# Altium footprint library 7-Connectors-12.PcbLib: 76 footprints (part 2 of 5)
Each footprint in its own frame and in the unit in brackets; x right, y up, seen from the top. Pads: shape width x height; smd on the part's side, far side on the other; paste and mask are expansions set on the pad; w line width, h text height; cw(c..) or ccw(c..) is an arc to the next point about the centre after c.
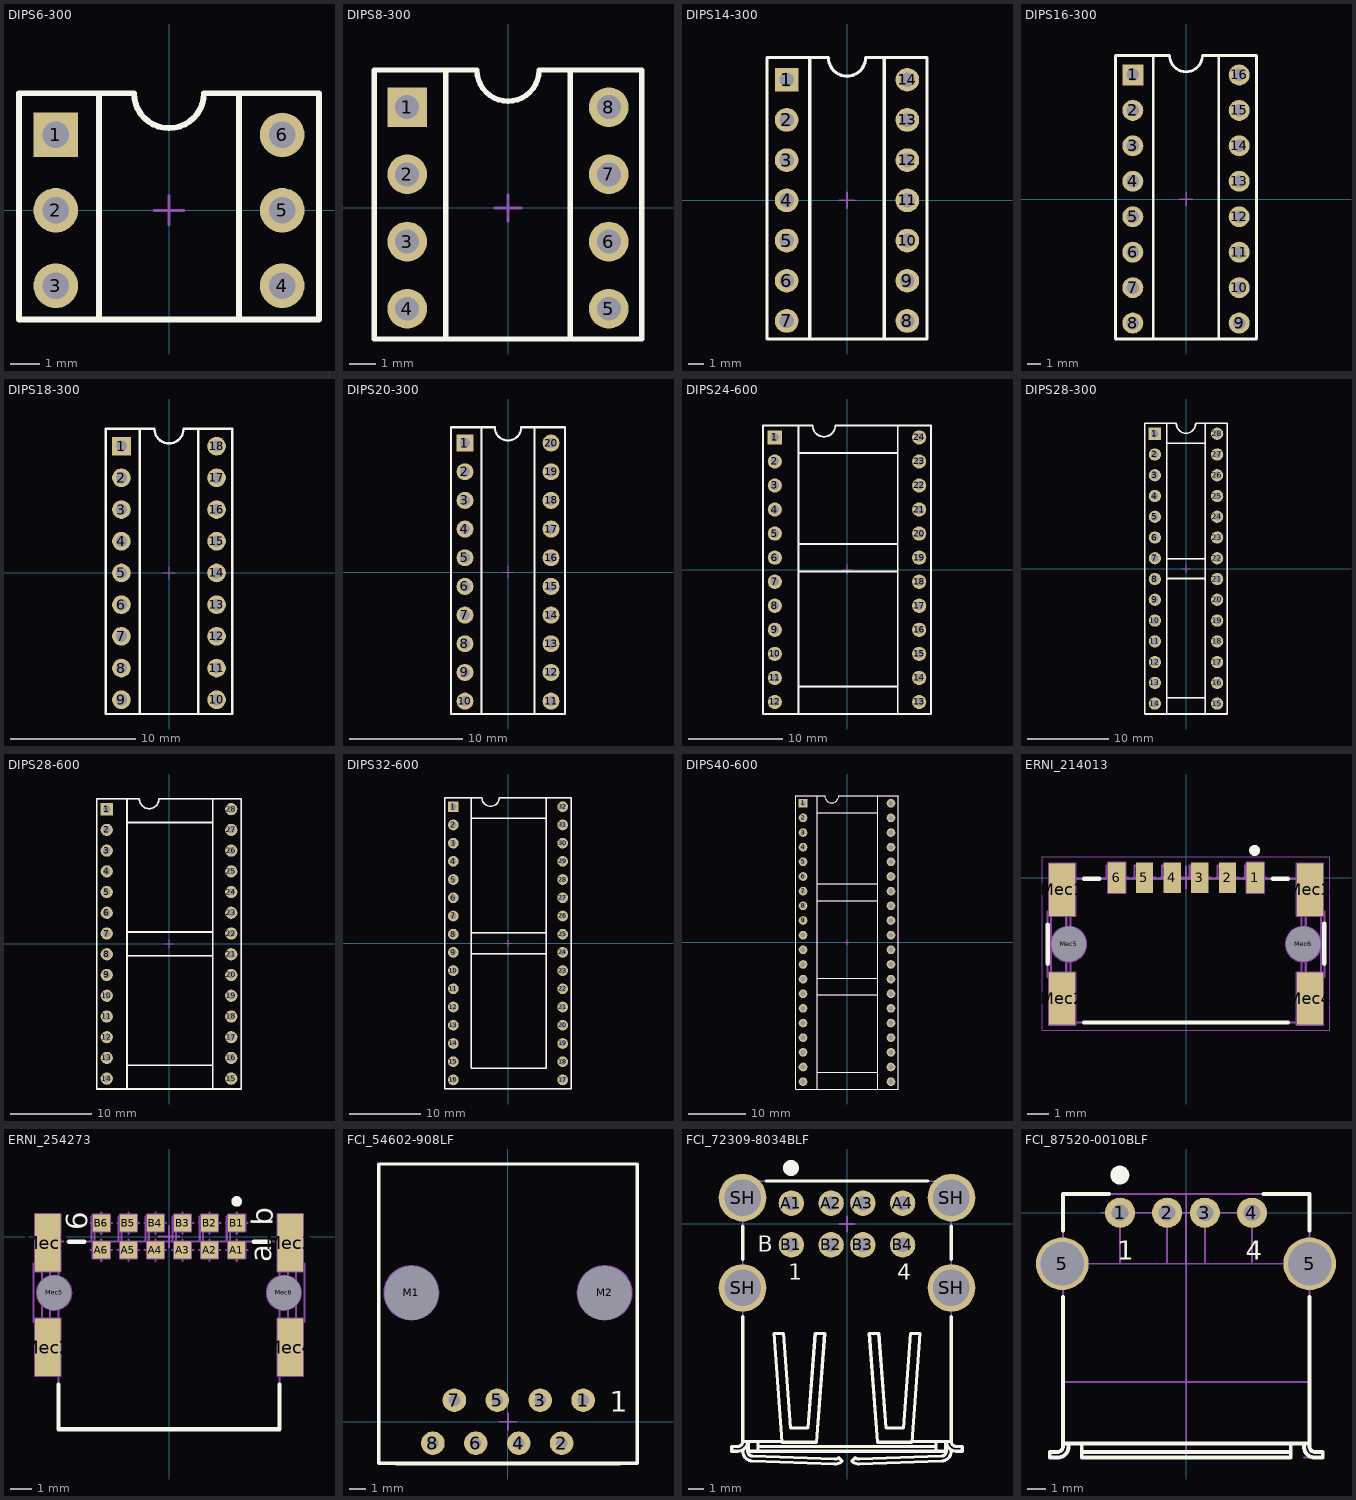
[diagram p1: the footprints below, top view; thin cyan lines are the x and y axes]

## DIPS6-300 [mm] "DIP Socket 6 Leads, Row Spacing 7.62 mm; Pitch 2.54 mm"
height 4.2
pads (6):
  rect 1.5x1.5 hole 0.9: 1(-3.81,2.54)
  round 1.5 hole 0.9: 2(-3.81,0) 3(-3.81,-2.54) 4(3.81,-2.54) 5(3.81,0) 6(3.81,2.54)
Top Overlay:
  lines w0.2: -2.35,-3.68 -2.35,3.94 ; 2.35,-3.68 2.35,3.94 ; -5.05,-3.68 5.05,-3.68 5.05,3.94 1.175,3.94 cw(c0,3.94) -1.175,3.94 -5.05,3.94 -5.05,-3.68
Mechanical 8:
  lines w0.1: -4.31,-2.41 -3.81,-2.41 ; -4.31,0.13 -3.81,0.13 ; -4.31,2.67 -3.81,2.67 ; -3.81,-2.91 -3.81,-2.41 ; -3.81,-1.91 -3.81,-2.41 ; -3.81,-0.37 -3.81,0.13 ; -3.81,0.63 -3.81,0.13 ; -3.81,2.17 -3.81,2.67 ; -3.81,3.17 -3.81,2.67 ; -3.31,-2.41 -3.81,-2.41 ; -3.31,0.13 -3.81,0.13 ; -3.31,2.67 -3.81,2.67 ; -0.5,0 0,0 ; 0,-0.5 0,0 ; 0,0.5 0,0 ; 0.5,0 0,0 ; 3.31,-2.41 3.81,-2.41 ; 3.31,0.13 3.81,0.13 ; 3.31,2.67 3.81,2.67 ; 3.81,-2.91 3.81,-2.41 ; 3.81,-1.91 3.81,-2.41 ; 3.81,-0.37 3.81,0.13 ; 3.81,0.63 3.81,0.13 ; 3.81,2.17 3.81,2.67 ; 3.81,3.17 3.81,2.67 ; 4.31,-2.41 3.81,-2.41 ; 4.31,0.13 3.81,0.13 ; 4.31,2.67 3.81,2.67
Mechanical 14:
  lines w0.1: -2.35,-3.68 -2.35,3.94 ; 2.35,-3.68 2.35,3.94 ; -5.05,-3.68 5.05,-3.68 5.05,3.94 1.175,3.94 cw(c0,3.94) -1.175,3.94 -5.05,3.94 -5.05,-3.68
3D body "DIPS6-300.stp": height 4.2, standoff -3.17, extent -5.05,-3.68 5.05,3.94

## DIPS8-300 [mm] "DIP Socket 8 Leads, Row Spacing 7.62 mm; Pitch 2.54 mm"
height 4.2
pads (8):
  rect 1.5x1.5 hole 0.9: 1(-3.81,3.81)
  round 1.5 hole 0.9: 2(-3.81,1.27) 3(-3.81,-1.27) 4(-3.81,-3.81) 5(3.81,-3.81) 6(3.81,-1.27) 7(3.81,1.27) 8(3.81,3.81)
Top Overlay:
  lines w0.2: -2.35,-4.95 -2.35,5.21 ; 2.35,-4.95 2.35,5.21 ; -5.05,-4.95 -5.05,5.21 -1.175,5.21 ccw(c0,5.21) 1.175,5.21 5.05,5.21 5.05,-4.95 -5.05,-4.95
Mechanical 8:
  lines w0.1: -4.31,-3.68 -3.81,-3.68 ; -4.31,-1.14 -3.81,-1.14 ; -4.31,1.4 -3.81,1.4 ; -4.31,3.94 -3.81,3.94 ; -3.81,-4.18 -3.81,-3.68 ; -3.81,-3.18 -3.81,-3.68 ; -3.81,-1.64 -3.81,-1.14 ; -3.81,-0.64 -3.81,-1.14 ; -3.81,0.9 -3.81,1.4 ; -3.81,1.9 -3.81,1.4 ; -3.81,3.44 -3.81,3.94 ; -3.81,4.44 -3.81,3.94 ; -3.31,-3.68 -3.81,-3.68 ; -3.31,-1.14 -3.81,-1.14 ; -3.31,1.4 -3.81,1.4 ; -3.31,3.94 -3.81,3.94 ; -0.5,0 0,0 ; 0,-0.5 0,0 ; 0,0.5 0,0 ; 0.5,0 0,0 ; 3.31,-3.68 3.81,-3.68 ; 3.31,-1.14 3.81,-1.14 ; 3.31,1.4 3.81,1.4 ; 3.31,3.94 3.81,3.94 ; 3.81,-4.18 3.81,-3.68 ; 3.81,-3.18 3.81,-3.68 ; 3.81,-1.64 3.81,-1.14 ; 3.81,-0.64 3.81,-1.14 ; 3.81,0.9 3.81,1.4 ; 3.81,1.9 3.81,1.4 ; 3.81,3.44 3.81,3.94 ; 3.81,4.44 3.81,3.94 ; 4.31,-3.68 3.81,-3.68 ; 4.31,-1.14 3.81,-1.14 ; 4.31,1.4 3.81,1.4 ; 4.31,3.94 3.81,3.94
Mechanical 14:
  lines w0.1: -2.35,-4.95 -2.35,5.21 ; 2.35,-4.95 2.35,5.21 ; -5.05,-4.95 -5.05,5.21 -1.175,5.21 ccw(c0,5.21) 1.175,5.21 5.05,5.21 5.05,-4.95 -5.05,-4.95
3D body "DIPS8-300.stp": height 4.2, standoff -3.17, extent -5.05,-5.05 5.05,5.05

## DIPS14-300 [mm] "DIP  Socket 14 Leads, Row Spacing 7.62 mm; Pitch 2.54 mm"
height 4.2
pads (14):
  rect 1.5x1.5 hole 0.9: 1(-3.81,7.62)
  round 1.5 hole 0.9: 2(-3.81,5.08) 3(-3.81,2.54) 4(-3.81,0) 5(-3.81,-2.54) 6(-3.81,-5.08) 7(-3.81,-7.62) 8(3.81,-7.62) 9(3.81,-5.08) 10(3.81,-2.54) 11(3.81,0) 12(3.81,2.54) 13(3.81,5.08) 14(3.81,7.62)
Top Overlay:
  lines w0.2: -2.35,-8.76 -2.35,9.02 ; 2.35,-8.76 2.35,9.02 ; -5.05,-8.76 5.05,-8.76 5.05,9.02 1.175,9.02 cw(c0,9.02) -1.175,9.02 -5.05,9.02 -5.05,-8.76
Mechanical 8:
  lines w0.1: -4.31,-7.49 -3.81,-7.49 ; -4.31,-4.95 -3.81,-4.95 ; -4.31,-2.41 -3.81,-2.41 ; -4.31,0.13 -3.81,0.13 ; -4.31,2.67 -3.81,2.67 ; -4.31,5.21 -3.81,5.21 ; -4.31,7.75 -3.81,7.75 ; -3.81,-7.99 -3.81,-7.49 ; -3.81,-6.99 -3.81,-7.49 ; -3.81,-5.45 -3.81,-4.95 ; -3.81,-4.45 -3.81,-4.95 ; -3.81,-2.91 -3.81,-2.41 ; -3.81,-1.91 -3.81,-2.41 ; -3.81,-0.37 -3.81,0.13 ; -3.81,0.63 -3.81,0.13 ; -3.81,2.17 -3.81,2.67 ; -3.81,3.17 -3.81,2.67 ; -3.81,4.71 -3.81,5.21 ; -3.81,5.71 -3.81,5.21 ; -3.81,7.25 -3.81,7.75 ; -3.81,8.25 -3.81,7.75 ; -3.31,-7.49 -3.81,-7.49 ; -3.31,-4.95 -3.81,-4.95 ; -3.31,-2.41 -3.81,-2.41 ; -3.31,0.13 -3.81,0.13 ; -3.31,2.67 -3.81,2.67 ; -3.31,5.21 -3.81,5.21 ; -3.31,7.75 -3.81,7.75 ; -0.5,0 0,0 ; 0,-0.5 0,0 ; 0,0.5 0,0 ; 0.5,0 0,0 ; 3.31,-7.49 3.81,-7.49 ; 3.31,-4.95 3.81,-4.95 ; 3.31,-2.41 3.81,-2.41 ; 3.31,0.13 3.81,0.13 ; 3.31,2.67 3.81,2.67 ; 3.31,5.21 3.81,5.21 ; 3.31,7.75 3.81,7.75 ; 3.81,-7.99 3.81,-7.49 ; 3.81,-6.99 3.81,-7.49 ; 3.81,-5.45 3.81,-4.95 ; 3.81,-4.45 3.81,-4.95 ; 3.81,-2.91 3.81,-2.41 ; 3.81,-1.91 3.81,-2.41 ; 3.81,-0.37 3.81,0.13 ; 3.81,0.63 3.81,0.13 ; 3.81,2.17 3.81,2.67 ; 3.81,3.17 3.81,2.67 ; 3.81,4.71 3.81,5.21 ; 3.81,5.71 3.81,5.21 ; 3.81,7.25 3.81,7.75 ; 3.81,8.25 3.81,7.75 ; 4.31,-7.49 3.81,-7.49 ; 4.31,-4.95 3.81,-4.95 ; 4.31,-2.41 3.81,-2.41 ; 4.31,0.13 3.81,0.13 ; 4.31,2.67 3.81,2.67 ; 4.31,5.21 3.81,5.21 ; 4.31,7.75 3.81,7.75
Mechanical 14:
  lines w0.1: -2.35,-8.76 -2.35,9.02 ; 2.35,-8.76 2.35,9.02 ; -5.05,-8.76 5.05,-8.76 5.05,9.02 1.175,9.02 cw(c0,9.02) -1.175,9.02 -5.05,9.02 -5.05,-8.76
3D body "DIPS14-300.stp": height 4.2, standoff -3.17, extent -5.05,-8.8 5.05,8.98

## DIPS16-300 [mm] "DIP Socket 16 Leads, Row Spacing 7.62 mm; Pitch 2.54 mm"
height 4.2
pads (16):
  rect 1.5x1.5 hole 0.9: 1(-3.81,8.89)
  round 1.5 hole 0.9: 2(-3.81,6.35) 3(-3.81,3.81) 4(-3.81,1.27) 5(-3.81,-1.27) 6(-3.81,-3.81) 7(-3.81,-6.35) 8(-3.81,-8.89) 9(3.81,-8.89) 10(3.81,-6.35) 11(3.81,-3.81) 12(3.81,-1.27) 13(3.81,1.27) 14(3.81,3.81) 15(3.81,6.35) 16(3.81,8.89)
Top Overlay:
  lines w0.2: -2.35,-10.03 -2.35,10.29 ; 2.35,-10.03 2.35,10.29 ; -5.05,-10.03 -5.05,10.29 -1.175,10.29 ccw(c0,10.29) 1.175,10.29 5.05,10.29 5.05,-10.03 -5.05,-10.03
Mechanical 8:
  lines w0.1: -4.31,-8.76 -3.81,-8.76 ; -4.31,-6.22 -3.81,-6.22 ; -4.31,-3.68 -3.81,-3.68 ; -4.31,-1.14 -3.81,-1.14 ; -4.31,1.4 -3.81,1.4 ; -4.31,3.94 -3.81,3.94 ; -4.31,6.48 -3.81,6.48 ; -4.31,9.02 -3.81,9.02 ; -3.81,-9.26 -3.81,-8.76 ; -3.81,-8.26 -3.81,-8.76 ; -3.81,-6.72 -3.81,-6.22 ; -3.81,-5.72 -3.81,-6.22 ; -3.81,-4.18 -3.81,-3.68 ; -3.81,-3.18 -3.81,-3.68 ; -3.81,-1.64 -3.81,-1.14 ; -3.81,-0.64 -3.81,-1.14 ; -3.81,0.9 -3.81,1.4 ; -3.81,1.9 -3.81,1.4 ; -3.81,3.44 -3.81,3.94 ; -3.81,4.44 -3.81,3.94 ; -3.81,5.98 -3.81,6.48 ; -3.81,6.98 -3.81,6.48 ; -3.81,8.52 -3.81,9.02 ; -3.81,9.52 -3.81,9.02 ; -3.31,-8.76 -3.81,-8.76 ; -3.31,-6.22 -3.81,-6.22 ; -3.31,-3.68 -3.81,-3.68 ; -3.31,-1.14 -3.81,-1.14 ; -3.31,1.4 -3.81,1.4 ; -3.31,3.94 -3.81,3.94 ; -3.31,6.48 -3.81,6.48 ; -3.31,9.02 -3.81,9.02 ; -0.5,0 0,0 ; 0,-0.5 0,0 ; 0,0.5 0,0 ; 0.5,0 0,0 ; 3.31,-8.76 3.81,-8.76 ; 3.31,-6.22 3.81,-6.22 ; 3.31,-3.68 3.81,-3.68 ; 3.31,-1.14 3.81,-1.14 ; 3.31,1.4 3.81,1.4 ; 3.31,3.94 3.81,3.94 ; 3.31,6.48 3.81,6.48 ; 3.31,9.02 3.81,9.02 ; 3.81,-9.26 3.81,-8.76 ; 3.81,-8.26 3.81,-8.76 ; 3.81,-6.72 3.81,-6.22 ; 3.81,-5.72 3.81,-6.22 ; 3.81,-4.18 3.81,-3.68 ; 3.81,-3.18 3.81,-3.68 ; 3.81,-1.64 3.81,-1.14 ; 3.81,-0.64 3.81,-1.14 ; 3.81,0.9 3.81,1.4 ; 3.81,1.9 3.81,1.4 ; 3.81,3.44 3.81,3.94 ; 3.81,4.44 3.81,3.94 ; 3.81,5.98 3.81,6.48 ; 3.81,6.98 3.81,6.48 ; 3.81,8.52 3.81,9.02 ; 3.81,9.52 3.81,9.02 ; 4.31,-8.76 3.81,-8.76 ; 4.31,-6.22 3.81,-6.22 ; 4.31,-3.68 3.81,-3.68 ; 4.31,-1.14 3.81,-1.14 ; 4.31,1.4 3.81,1.4 ; 4.31,3.94 3.81,3.94 ; 4.31,6.48 3.81,6.48 ; 4.31,9.02 3.81,9.02
Mechanical 14:
  lines w0.1: -2.35,-10.03 -2.35,10.29 ; 2.35,-10.03 2.35,10.29 ; -5.05,-10.03 -5.05,10.29 -1.175,10.29 ccw(c0,10.29) 1.175,10.29 5.05,10.29 5.05,-10.03 -5.05,-10.03
3D body "DIPS16-300.stp": height 4.2, standoff -3.17, extent -5.05,-10.16 5.05,10.16

## DIPS18-300 [mm] "DIP Socket 18 Leads, Row Spacing 7.62 mm; Pitch 2.54 mm"
height 4.2
pads (18):
  rect 1.5x1.5 hole 0.9: 1(-3.81,10.16)
  round 1.5 hole 0.9: 2(-3.81,7.62) 3(-3.81,5.08) 4(-3.81,2.54) 5(-3.81,0) 6(-3.81,-2.54) 7(-3.81,-5.08) 8(-3.81,-7.62) 9(-3.81,-10.16) 10(3.81,-10.16) 11(3.81,-7.62) 12(3.81,-5.08) 13(3.81,-2.54) 14(3.81,0) 15(3.81,2.54) 16(3.81,5.08) 17(3.81,7.62) 18(3.81,10.16)
Top Overlay:
  lines w0.2: -2.35,-11.3 -2.35,11.56 ; 2.35,-11.3 2.35,11.56 ; -5.05,-11.3 5.05,-11.3 5.05,11.56 1.175,11.56 cw(c0,11.56) -1.175,11.56 -5.05,11.56 -5.05,-11.3
Mechanical 8:
  lines w0.05: -3.81,-10.44 -3.935,-10.44 -3.935,-9.88 -3.81,-9.88 ; -3.81,-7.9 -3.935,-7.9 -3.935,-7.34 -3.81,-7.34 ; -3.81,-5.36 -3.935,-5.36 -3.935,-4.8 -3.81,-4.8 ; -3.81,-2.82 -3.935,-2.82 -3.935,-2.26 -3.81,-2.26 ; -3.81,-0.28 -3.935,-0.28 -3.935,0.28 -3.81,0.28 ; -3.81,2.26 -3.935,2.26 -3.935,2.82 -3.81,2.82 ; -3.81,4.8 -3.935,4.8 -3.935,5.36 -3.81,5.36 ; -3.81,7.34 -3.935,7.34 -3.935,7.9 -3.81,7.9 ; -3.81,9.88 -3.935,9.88 -3.935,10.44 -3.81,10.44 ; 3.81,-10.44 3.935,-10.44 3.935,-9.88 3.81,-9.88 ; 3.81,-7.9 3.935,-7.9 3.935,-7.34 3.81,-7.34 ; 3.81,-5.36 3.935,-5.36 3.935,-4.8 3.81,-4.8 ; 3.81,-2.82 3.935,-2.82 3.935,-2.26 3.81,-2.26 ; 3.81,-0.28 3.935,-0.28 3.935,0.28 3.81,0.28 ; 3.81,2.26 3.935,2.26 3.935,2.82 3.81,2.82 ; 3.81,4.8 3.935,4.8 3.935,5.36 3.81,5.36 ; 3.81,7.34 3.935,7.34 3.935,7.9 3.81,7.9 ; 3.81,9.88 3.935,9.88 3.935,10.44 3.81,10.44
  lines w0.1: -4.31,-10.03 -3.81,-10.03 ; -4.31,-7.49 -3.81,-7.49 ; -4.31,-4.95 -3.81,-4.95 ; -4.31,-2.41 -3.81,-2.41 ; -4.31,0.13 -3.81,0.13 ; -4.31,2.67 -3.81,2.67 ; -4.31,5.21 -3.81,5.21 ; -4.31,7.75 -3.81,7.75 ; -4.31,10.29 -3.81,10.29 ; -3.81,-10.53 -3.81,-10.03 ; -3.81,-9.53 -3.81,-10.03 ; -3.81,-7.99 -3.81,-7.49 ; -3.81,-6.99 -3.81,-7.49 ; -3.81,-5.45 -3.81,-4.95 ; -3.81,-4.45 -3.81,-4.95 ; -3.81,-2.91 -3.81,-2.41 ; -3.81,-1.91 -3.81,-2.41 ; -3.81,-0.37 -3.81,0.13 ; -3.81,0.63 -3.81,0.13 ; -3.81,2.17 -3.81,2.67 ; -3.81,3.17 -3.81,2.67 ; -3.81,4.71 -3.81,5.21 ; -3.81,5.71 -3.81,5.21 ; -3.81,7.25 -3.81,7.75 ; -3.81,8.25 -3.81,7.75 ; -3.81,9.79 -3.81,10.29 ; -3.81,10.79 -3.81,10.29 ; -3.31,-10.03 -3.81,-10.03 ; -3.31,-7.49 -3.81,-7.49 ; -3.31,-4.95 -3.81,-4.95 ; -3.31,-2.41 -3.81,-2.41 ; -3.31,0.13 -3.81,0.13 ; -3.31,2.67 -3.81,2.67 ; -3.31,5.21 -3.81,5.21 ; -3.31,7.75 -3.81,7.75 ; -3.31,10.29 -3.81,10.29 ; -0.5,0 0,0 ; 0,-0.5 0,0 ; 0,0.5 0,0 ; 0.5,0 0,0 ; 3.31,-10.03 3.81,-10.03 ; 3.31,-7.49 3.81,-7.49 ; 3.31,-4.95 3.81,-4.95 ; 3.31,-2.41 3.81,-2.41 ; 3.31,0.13 3.81,0.13 ; 3.31,2.67 3.81,2.67 ; 3.31,5.21 3.81,5.21 ; 3.31,7.75 3.81,7.75 ; 3.31,10.29 3.81,10.29 ; 3.81,-10.53 3.81,-10.03 ; 3.81,-9.53 3.81,-10.03 ; 3.81,-7.99 3.81,-7.49 ; 3.81,-6.99 3.81,-7.49 ; 3.81,-5.45 3.81,-4.95 ; 3.81,-4.45 3.81,-4.95 ; 3.81,-2.91 3.81,-2.41 ; 3.81,-1.91 3.81,-2.41 ; 3.81,-0.37 3.81,0.13 ; 3.81,0.63 3.81,0.13 ; 3.81,2.17 3.81,2.67 ; 3.81,3.17 3.81,2.67 ; 3.81,4.71 3.81,5.21 ; 3.81,5.71 3.81,5.21 ; 3.81,7.25 3.81,7.75 ; 3.81,8.25 3.81,7.75 ; 3.81,9.79 3.81,10.29 ; 3.81,10.79 3.81,10.29 ; 4.31,-10.03 3.81,-10.03 ; 4.31,-7.49 3.81,-7.49 ; 4.31,-4.95 3.81,-4.95 ; 4.31,-2.41 3.81,-2.41 ; 4.31,0.13 3.81,0.13 ; 4.31,2.67 3.81,2.67 ; 4.31,5.21 3.81,5.21 ; 4.31,7.75 3.81,7.75 ; 4.31,10.29 3.81,10.29
Mechanical 14:
  lines w0.1: -2.35,-11.3 -2.35,11.56 ; 2.35,-11.3 2.35,11.56 ; -5.05,-11.3 5.05,-11.3 5.05,11.56 1.175,11.56 cw(c0,11.56) -1.175,11.56 -5.05,11.56 -5.05,-11.3
3D body "DIPS18-300.stp": height 4.2, standoff -3.17, extent -5.05,-11.43 5.05,11.43

## DIPS20-300 [mm] "DIP Sockat 20 Leads, Row Spacing 7.62 mm; Pitch 2.54 mm"
height 4.2
pads (20):
  rect 1.5x1.5 hole 0.9: 1(-3.81,11.43)
  round 1.5 hole 0.9: 2(-3.81,8.89) 3(-3.81,6.35) 4(-3.81,3.81) 5(-3.81,1.27) 6(-3.81,-1.27) 7(-3.81,-3.81) 8(-3.81,-6.35) 9(-3.81,-8.89) 10(-3.81,-11.43) 11(3.81,-11.43) 12(3.81,-8.89) 13(3.81,-6.35) 14(3.81,-3.81) 15(3.81,-1.27) 16(3.81,1.27) 17(3.81,3.81) 18(3.81,6.35) 19(3.81,8.89) 20(3.81,11.43)
Top Overlay:
  lines w0.2: -2.35,-12.57 -2.35,12.83 ; 2.35,-12.57 2.35,12.83 ; -5.05,-12.57 -5.05,12.83 -1.175,12.83 ccw(c0,12.83) 1.175,12.83 5.05,12.83 5.05,-12.57 -5.05,-12.57
Mechanical 8:
  lines w0.1: -4.31,-11.3 -3.81,-11.3 ; -4.31,-8.76 -3.81,-8.76 ; -4.31,-6.22 -3.81,-6.22 ; -4.31,-3.68 -3.81,-3.68 ; -4.31,-1.14 -3.81,-1.14 ; -4.31,1.4 -3.81,1.4 ; -4.31,3.94 -3.81,3.94 ; -4.31,6.48 -3.81,6.48 ; -4.31,9.02 -3.81,9.02 ; -4.31,11.56 -3.81,11.56 ; -3.81,-11.8 -3.81,-11.3 ; -3.81,-10.8 -3.81,-11.3 ; -3.81,-9.26 -3.81,-8.76 ; -3.81,-8.26 -3.81,-8.76 ; -3.81,-6.72 -3.81,-6.22 ; -3.81,-5.72 -3.81,-6.22 ; -3.81,-4.18 -3.81,-3.68 ; -3.81,-3.18 -3.81,-3.68 ; -3.81,-1.64 -3.81,-1.14 ; -3.81,-0.64 -3.81,-1.14 ; -3.81,0.9 -3.81,1.4 ; -3.81,1.9 -3.81,1.4 ; -3.81,3.44 -3.81,3.94 ; -3.81,4.44 -3.81,3.94 ; -3.81,5.98 -3.81,6.48 ; -3.81,6.98 -3.81,6.48 ; -3.81,8.52 -3.81,9.02 ; -3.81,9.52 -3.81,9.02 ; -3.81,11.06 -3.81,11.56 ; -3.81,12.06 -3.81,11.56 ; -3.31,-11.3 -3.81,-11.3 ; -3.31,-8.76 -3.81,-8.76 ; -3.31,-6.22 -3.81,-6.22 ; -3.31,-3.68 -3.81,-3.68 ; -3.31,-1.14 -3.81,-1.14 ; -3.31,1.4 -3.81,1.4 ; -3.31,3.94 -3.81,3.94 ; -3.31,6.48 -3.81,6.48 ; -3.31,9.02 -3.81,9.02 ; -3.31,11.56 -3.81,11.56 ; -0.5,0 0,0 ; 0,-0.5 0,0 ; 0,0.5 0,0 ; 0.5,0 0,0 ; 3.31,-11.3 3.81,-11.3 ; 3.31,-8.76 3.81,-8.76 ; 3.31,-6.22 3.81,-6.22 ; 3.31,-3.68 3.81,-3.68 ; 3.31,-1.14 3.81,-1.14 ; 3.31,1.4 3.81,1.4 ; 3.31,3.94 3.81,3.94 ; 3.31,6.48 3.81,6.48 ; 3.31,9.02 3.81,9.02 ; 3.31,11.56 3.81,11.56 ; 3.81,-11.8 3.81,-11.3 ; 3.81,-10.8 3.81,-11.3 ; 3.81,-9.26 3.81,-8.76 ; 3.81,-8.26 3.81,-8.76 ; 3.81,-6.72 3.81,-6.22 ; 3.81,-5.72 3.81,-6.22 ; 3.81,-4.18 3.81,-3.68 ; 3.81,-3.18 3.81,-3.68 ; 3.81,-1.64 3.81,-1.14 ; 3.81,-0.64 3.81,-1.14 ; 3.81,0.9 3.81,1.4 ; 3.81,1.9 3.81,1.4 ; 3.81,3.44 3.81,3.94 ; 3.81,4.44 3.81,3.94 ; 3.81,5.98 3.81,6.48 ; 3.81,6.98 3.81,6.48 ; 3.81,8.52 3.81,9.02 ; 3.81,9.52 3.81,9.02 ; 3.81,11.06 3.81,11.56 ; 3.81,12.06 3.81,11.56 ; 4.31,-11.3 3.81,-11.3 ; 4.31,-8.76 3.81,-8.76 ; 4.31,-6.22 3.81,-6.22 ; 4.31,-3.68 3.81,-3.68 ; 4.31,-1.14 3.81,-1.14 ; 4.31,1.4 3.81,1.4 ; 4.31,3.94 3.81,3.94 ; 4.31,6.48 3.81,6.48 ; 4.31,9.02 3.81,9.02 ; 4.31,11.56 3.81,11.56
Mechanical 14:
  lines w0.1: -2.35,-12.57 -2.35,12.83 ; 2.35,-12.57 2.35,12.83 ; -5.05,-12.57 -5.05,12.83 -1.175,12.83 ccw(c0,12.83) 1.175,12.83 5.05,12.83 5.05,-12.57 -5.05,-12.57
3D body "DIPS20-300.stp": height 4.2, standoff -3.17, extent -5.05,-12.7 5.05,12.7

## DIPS24-600 [mm] "DIP Socket 24 Leads, Row Spacing 15.24mm; Pitch 2.54mm"
height 4.2
pads (24):
  rect 1.5x1.5 hole 0.9: 1(-7.62,13.97)
  round 1.5 hole 0.9: 2(-7.62,11.43) 3(-7.62,8.89) 4(-7.62,6.35) 5(-7.62,3.81) 6(-7.62,1.27) 7(-7.62,-1.27) 8(-7.62,-3.81) 9(-7.62,-6.35) 10(-7.62,-8.89) 11(-7.62,-11.43) 12(-7.62,-13.97) 13(7.62,-13.97) 14(7.62,-11.43) 15(7.62,-8.89) 16(7.62,-6.35) 17(7.62,-3.81) 18(7.62,-1.27) 19(7.62,1.27) 20(7.62,3.81) 21(7.62,6.35) 22(7.62,8.89) 23(7.62,11.43) 24(7.62,13.97)
Top Overlay:
  lines w0.2: -5.14,-15.24 -5.14,15.24 ; -5.14,-12.34 5.36,-12.34 ; -5.14,-0.18 5.36,-0.18 ; -5.14,2.72 5.36,2.72 ; -5.14,12.34 5.36,12.34 ; 5.36,-15.24 5.36,15.24 ; -8.85,-15.24 -8.85,15.24 -3.63,15.24 ccw(c-2.43,15.24) -1.23,15.24 8.85,15.24 8.85,-15.24 -8.85,-15.24
Mechanical 8:
  lines w0.1: -8.12,-13.97 -7.62,-13.97 ; -8.12,-11.43 -7.62,-11.43 ; -8.12,-8.89 -7.62,-8.89 ; -8.12,-6.35 -7.62,-6.35 ; -8.12,-3.81 -7.62,-3.81 ; -8.12,-1.27 -7.62,-1.27 ; -8.12,1.27 -7.62,1.27 ; -8.12,3.81 -7.62,3.81 ; -8.12,6.35 -7.62,6.35 ; -8.12,8.89 -7.62,8.89 ; -8.12,11.43 -7.62,11.43 ; -8.12,13.97 -7.62,13.97 ; -7.62,-14.47 -7.62,-13.97 ; -7.62,-13.47 -7.62,-13.97 ; -7.62,-11.93 -7.62,-11.43 ; -7.62,-10.93 -7.62,-11.43 ; -7.62,-9.39 -7.62,-8.89 ; -7.62,-8.39 -7.62,-8.89 ; -7.62,-6.85 -7.62,-6.35 ; -7.62,-5.85 -7.62,-6.35 ; -7.62,-4.31 -7.62,-3.81 ; -7.62,-3.31 -7.62,-3.81 ; -7.62,-1.77 -7.62,-1.27 ; -7.62,-0.77 -7.62,-1.27 ; -7.62,0.77 -7.62,1.27 ; -7.62,1.77 -7.62,1.27 ; -7.62,3.31 -7.62,3.81 ; -7.62,4.31 -7.62,3.81 ; -7.62,5.85 -7.62,6.35 ; -7.62,6.85 -7.62,6.35 ; -7.62,8.39 -7.62,8.89 ; -7.62,9.39 -7.62,8.89 ; -7.62,10.93 -7.62,11.43 ; -7.62,11.93 -7.62,11.43 ; -7.62,13.47 -7.62,13.97 ; -7.62,14.47 -7.62,13.97 ; -7.12,-13.97 -7.62,-13.97 ; -7.12,-11.43 -7.62,-11.43 ; -7.12,-8.89 -7.62,-8.89 ; -7.12,-6.35 -7.62,-6.35 ; -7.12,-3.81 -7.62,-3.81 ; -7.12,-1.27 -7.62,-1.27 ; -7.12,1.27 -7.62,1.27 ; -7.12,3.81 -7.62,3.81 ; -7.12,6.35 -7.62,6.35 ; -7.12,8.89 -7.62,8.89 ; -7.12,11.43 -7.62,11.43 ; -7.12,13.97 -7.62,13.97 ; -0.5,0 0,0 ; 0,-0.5 0,0 ; 0,0.5 0,0 ; 0.5,0 0,0 ; 7.12,-13.97 7.62,-13.97 ; 7.12,-11.43 7.62,-11.43 ; 7.12,-8.89 7.62,-8.89 ; 7.12,-6.35 7.62,-6.35 ; 7.12,-3.81 7.62,-3.81 ; 7.12,-1.27 7.62,-1.27 ; 7.12,1.27 7.62,1.27 ; 7.12,3.81 7.62,3.81 ; 7.12,6.35 7.62,6.35 ; 7.12,8.89 7.62,8.89 ; 7.12,11.43 7.62,11.43 ; 7.12,13.97 7.62,13.97 ; 7.62,-14.47 7.62,-13.97 ; 7.62,-13.47 7.62,-13.97 ; 7.62,-11.93 7.62,-11.43 ; 7.62,-10.93 7.62,-11.43 ; 7.62,-9.39 7.62,-8.89 ; 7.62,-8.39 7.62,-8.89 ; 7.62,-6.85 7.62,-6.35 ; 7.62,-5.85 7.62,-6.35 ; 7.62,-4.31 7.62,-3.81 ; 7.62,-3.31 7.62,-3.81 ; 7.62,-1.77 7.62,-1.27 ; 7.62,-0.77 7.62,-1.27 ; 7.62,0.77 7.62,1.27 ; 7.62,1.77 7.62,1.27 ; 7.62,3.31 7.62,3.81 ; 7.62,4.31 7.62,3.81 ; 7.62,5.85 7.62,6.35 ; 7.62,6.85 7.62,6.35 ; 7.62,8.39 7.62,8.89 ; 7.62,9.39 7.62,8.89 ; 7.62,10.93 7.62,11.43 ; 7.62,11.93 7.62,11.43 ; 7.62,13.47 7.62,13.97 ; 7.62,14.47 7.62,13.97 ; 8.12,-13.97 7.62,-13.97 ; 8.12,-11.43 7.62,-11.43 ; 8.12,-8.89 7.62,-8.89 ; 8.12,-6.35 7.62,-6.35 ; 8.12,-3.81 7.62,-3.81 ; 8.12,-1.27 7.62,-1.27 ; 8.12,1.27 7.62,1.27 ; 8.12,3.81 7.62,3.81 ; 8.12,6.35 7.62,6.35 ; 8.12,8.89 7.62,8.89 ; 8.12,11.43 7.62,11.43 ; 8.12,13.97 7.62,13.97
Mechanical 14:
  lines w0.1: -5.14,-15.24 -5.14,15.24 ; -5.14,-12.34 5.36,-12.34 ; -5.14,-0.18 5.36,-0.18 ; -5.14,2.72 5.36,2.72 ; -5.14,12.34 5.36,12.34 ; 5.36,-15.24 5.36,15.24 ; -8.85,-15.24 -8.85,15.24 -3.63,15.24 ccw(c-2.43,15.24) -1.23,15.24 8.85,15.24 8.85,-15.24 -8.85,-15.24
3D body "DIPS24-600.stp": height 4.2, standoff -3.17, extent -8.85,-15.24 8.85,15.24

## DIPS28-300 [mm] "DIP Socket 28 Leads, Row Spacing 7.62mm; Pitch 2.54mm"
height 4.2
pads (28):
  rect 1.5x1.5 hole 0.9: 1(-3.81,16.51)
  round 1.5 hole 0.9: 2(-3.81,13.97) 3(-3.81,11.43) 4(-3.81,8.89) 5(-3.81,6.35) 6(-3.81,3.81) 7(-3.81,1.27) 8(-3.81,-1.27) 9(-3.81,-3.81) 10(-3.81,-6.35) 11(-3.81,-8.89) 12(-3.81,-11.43) 13(-3.81,-13.97) 14(-3.81,-16.51) 15(3.81,-16.51) 16(3.81,-13.97) 17(3.81,-11.43) 18(3.81,-8.89) 19(3.81,-6.35) 20(3.81,-3.81) 21(3.81,-1.27) 22(3.81,1.27) 23(3.81,3.81) 24(3.81,6.35) 25(3.81,8.89) 26(3.81,11.43) 27(3.81,13.97) 28(3.81,16.51)
Top Overlay:
  lines w0.2: -2.35,-17.78 -2.35,17.78 ; -2.35,-15.78 2.35,-15.78 ; -2.35,-1.2 2.35,-1.2 ; -2.35,1.2 2.35,1.2 ; -2.35,15.35 2.35,15.35 ; 2.35,-17.78 2.35,17.78 ; -5.05,-17.78 5.05,-17.78 5.05,17.78 1.175,17.78 cw(c0,17.75) -1.175,17.78 -5.05,17.78 -5.05,-17.78
Mechanical 8:
  lines w0.1: -4.31,-16.51 -3.81,-16.51 ; -4.31,-13.97 -3.81,-13.97 ; -4.31,-11.43 -3.81,-11.43 ; -4.31,-8.89 -3.81,-8.89 ; -4.31,-6.35 -3.81,-6.35 ; -4.31,-3.81 -3.81,-3.81 ; -4.31,-1.27 -3.81,-1.27 ; -4.31,1.27 -3.81,1.27 ; -4.31,3.81 -3.81,3.81 ; -4.31,6.35 -3.81,6.35 ; -4.31,8.89 -3.81,8.89 ; -4.31,11.43 -3.81,11.43 ; -4.31,13.97 -3.81,13.97 ; -4.31,16.51 -3.81,16.51 ; -3.81,-17.01 -3.81,-16.51 ; -3.81,-16.01 -3.81,-16.51 ; -3.81,-14.47 -3.81,-13.97 ; -3.81,-13.47 -3.81,-13.97 ; -3.81,-11.93 -3.81,-11.43 ; -3.81,-10.93 -3.81,-11.43 ; -3.81,-9.39 -3.81,-8.89 ; -3.81,-8.39 -3.81,-8.89 ; -3.81,-6.85 -3.81,-6.35 ; -3.81,-5.85 -3.81,-6.35 ; -3.81,-4.31 -3.81,-3.81 ; -3.81,-3.31 -3.81,-3.81 ; -3.81,-1.77 -3.81,-1.27 ; -3.81,-0.77 -3.81,-1.27 ; -3.81,0.77 -3.81,1.27 ; -3.81,1.77 -3.81,1.27 ; -3.81,3.31 -3.81,3.81 ; -3.81,4.31 -3.81,3.81 ; -3.81,5.85 -3.81,6.35 ; -3.81,6.85 -3.81,6.35 ; -3.81,8.39 -3.81,8.89 ; -3.81,9.39 -3.81,8.89 ; -3.81,10.93 -3.81,11.43 ; -3.81,11.93 -3.81,11.43 ; -3.81,13.47 -3.81,13.97 ; -3.81,14.47 -3.81,13.97 ; -3.81,16.01 -3.81,16.51 ; -3.81,17.01 -3.81,16.51 ; -3.31,-16.51 -3.81,-16.51 ; -3.31,-13.97 -3.81,-13.97 ; -3.31,-11.43 -3.81,-11.43 ; -3.31,-8.89 -3.81,-8.89 ; -3.31,-6.35 -3.81,-6.35 ; -3.31,-3.81 -3.81,-3.81 ; -3.31,-1.27 -3.81,-1.27 ; -3.31,1.27 -3.81,1.27 ; -3.31,3.81 -3.81,3.81 ; -3.31,6.35 -3.81,6.35 ; -3.31,8.89 -3.81,8.89 ; -3.31,11.43 -3.81,11.43 ; -3.31,13.97 -3.81,13.97 ; -3.31,16.51 -3.81,16.51 ; -0.5,0 0,0 ; 0,-0.5 0,0 ; 0,0.5 0,0 ; 0.5,0 0,0 ; 3.31,-16.51 3.81,-16.51 ; 3.31,-13.97 3.81,-13.97 ; 3.31,-11.43 3.81,-11.43 ; 3.31,-8.89 3.81,-8.89 ; 3.31,-6.35 3.81,-6.35 ; 3.31,-3.81 3.81,-3.81 ; 3.31,-1.27 3.81,-1.27 ; 3.31,1.27 3.81,1.27 ; 3.31,6.35 3.81,6.35 ; 3.31,8.89 3.81,8.89 ; 3.31,11.43 3.81,11.43 ; 3.31,13.97 3.81,13.97 ; 3.31,16.51 3.81,16.51 ; 3.81,-17.01 3.81,-16.51 ; 3.81,-16.01 3.81,-16.51 ; 3.81,-14.47 3.81,-13.97 ; 3.81,-13.47 3.81,-13.97 ; 3.81,-11.93 3.81,-11.43 ; 3.81,-10.93 3.81,-11.43 ; 3.81,-9.39 3.81,-8.89 ; 3.81,-8.39 3.81,-8.89 ; 3.81,-6.85 3.81,-6.35 ; 3.81,-5.85 3.81,-6.35 ; 3.81,-4.31 3.81,-3.81 ; 3.81,-3.31 3.81,-3.81 ; 3.81,-1.77 3.81,-1.27 ; 3.81,-0.77 3.81,-1.27 ; 3.81,0.77 3.81,1.27 ; 3.81,1.77 3.81,1.27 ; 3.81,5.85 3.81,6.35 ; 3.81,6.85 3.81,6.35 ; 3.81,8.39 3.81,8.89 ; 3.81,9.39 3.81,8.89 ; 3.81,10.93 3.81,11.43 ; 3.81,11.93 3.81,11.43 ; 3.81,13.47 3.81,13.97 ; 3.81,14.47 3.81,13.97 ; 3.81,16.01 3.81,16.51 ; 3.81,17.01 3.81,16.51 ; 4.31,-16.51 3.81,-16.51 ; 4.31,-13.97 3.81,-13.97 ; 4.31,-11.43 3.81,-11.43 ; 4.31,-8.89 3.81,-8.89 ; 4.31,-6.35 3.81,-6.35 ; 4.31,-3.81 3.81,-3.81 ; 4.31,-1.27 3.81,-1.27 ; 4.31,1.27 3.81,1.27 ; 4.31,6.35 3.81,6.35 ; 4.31,8.89 3.81,8.89 ; 4.31,11.43 3.81,11.43 ; 4.31,13.97 3.81,13.97 ; 4.31,16.51 3.81,16.51 ; 3.81,3.81 3.81,4.31 3.81,3.81 ; 3.81,3.81 3.81,3.31 3.81,3.81 ; 3.81,3.81 4.31,3.81 3.81,3.81 ; 3.81,3.81 3.31,3.81 3.81,3.81
Mechanical 14:
  lines w0.1: -2.35,-17.78 -2.35,17.78 ; -2.35,-15.78 2.35,-15.78 ; -2.35,-1.2 2.35,-1.2 ; -2.35,1.2 2.35,1.2 ; -2.35,15.35 2.35,15.35 ; 2.35,-17.78 2.35,17.78 ; -5.05,-17.78 5.05,-17.78 5.05,17.78 1.175,17.78 cw(c0,17.75) -1.175,17.78 -5.05,17.78 -5.05,-17.78
3D body "DIPS28-300.stp": height 4.2, standoff -3.17, extent -5.05,-17.78 5.05,17.78
